# Altium footprint library nccpcblib.PcbLib: 63 footprints (part 3 of 4)
Each footprint in its own frame and in the unit in brackets; x right, y up, seen from the top. Pads: shape width x height; smd on the part's side, far side on the other; paste and mask are expansions set on the pad; w line width, h text height; cw(c..) or ccw(c..) is an arc to the next point about the centre after c.
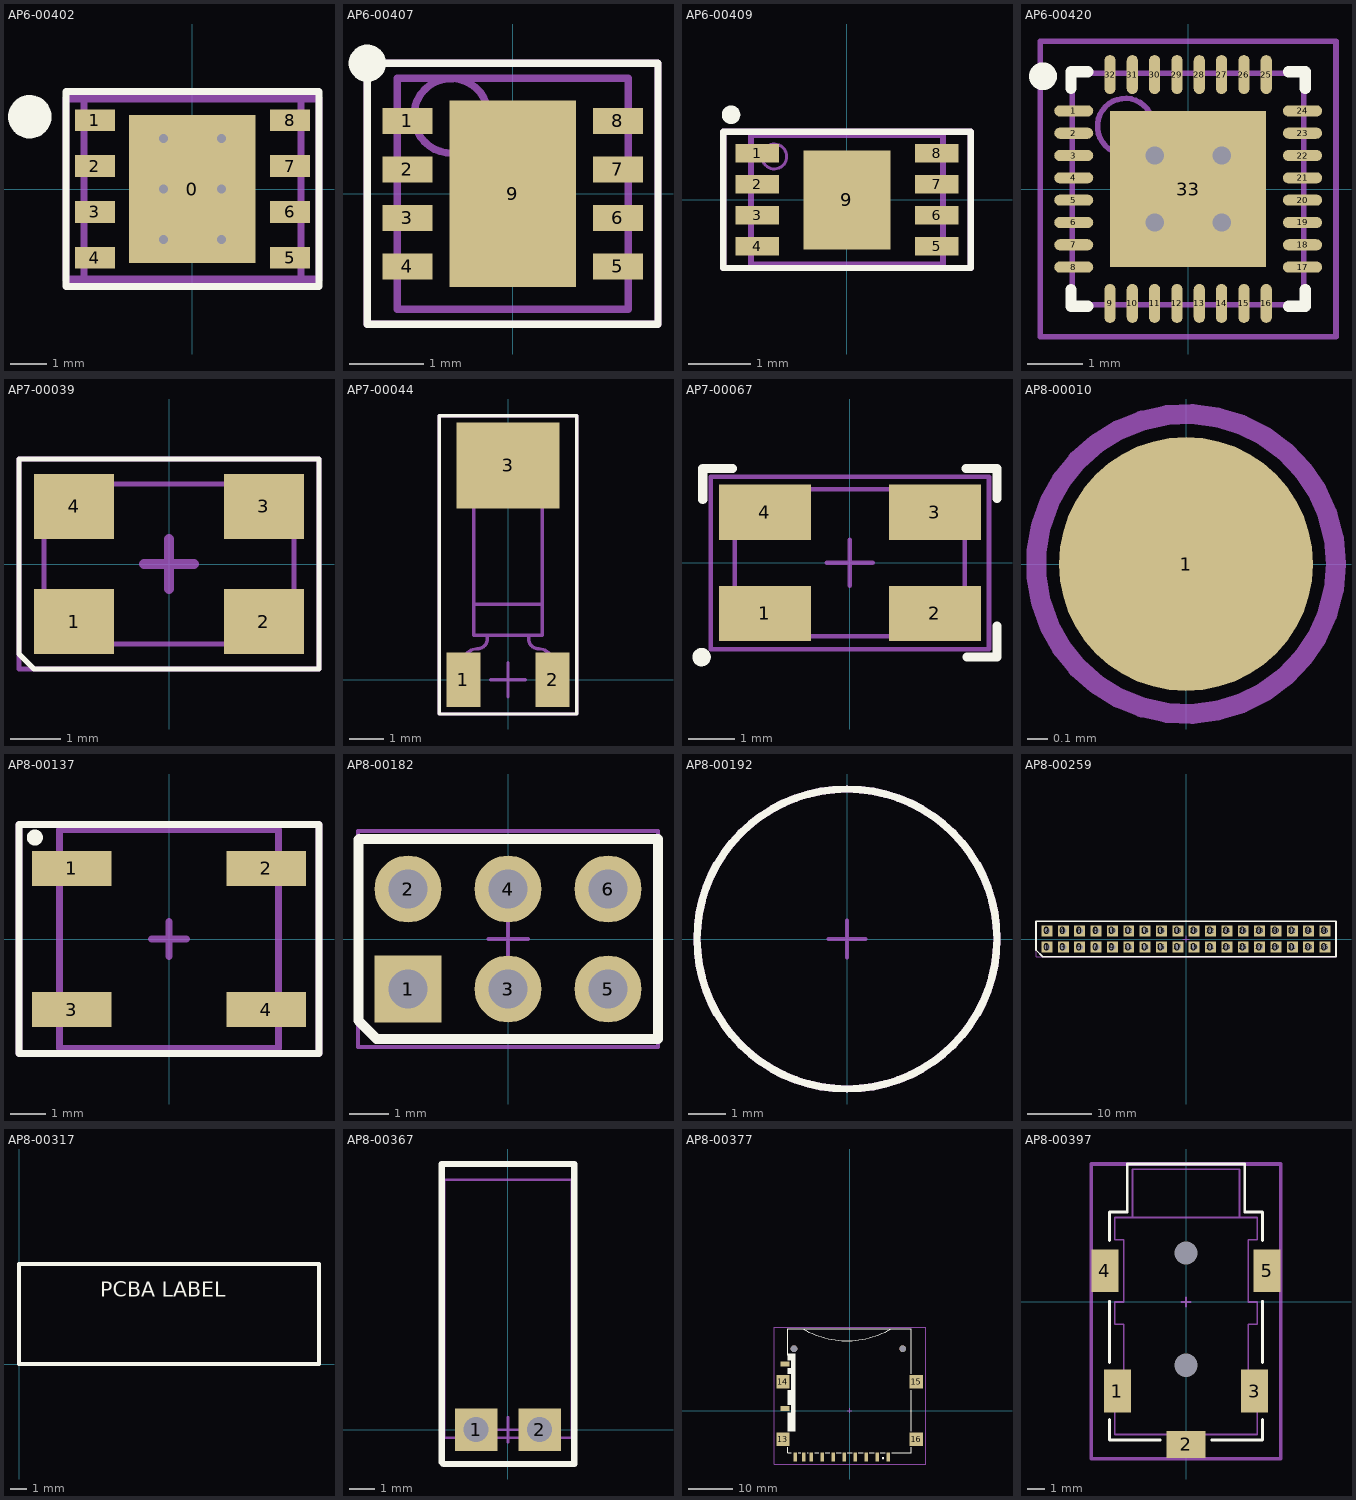
[diagram p2: the footprints below, top view; thin cyan lines are the x and y axes]

## AP6-00402 [mm]
height 5.08
pads (9):
  rect 3.5x4.1 smd: 0(0,0)
  rect 1.1x0.6 smd: 1(-2.7,1.905) 2(-2.7,0.635) 3(-2.7,-0.635) 4(-2.7,-1.905) 5(2.7,-1.905) 6(2.7,-0.635) 7(2.7,0.635) 8(2.7,1.905)
via 0.8,0 diameter 0.55 hole 0.25
via -0.8,-1.4 diameter 0.55 hole 0.25
via 0.8,-1.4 diameter 0.55 hole 0.25
via -0.8,0 diameter 0.8 hole 0.25
via 0.8,1.4 diameter 0.55 hole 0.25
via -0.8,1.4 diameter 0.55 hole 0.25
Top Overlay:
  circle w0.6: c-4.5,2 r0.3
  lines w0.2: -3.5,-2.7 -3.5,2.7 3.5,2.7 3.5,-2.7 -3.5,-2.7
Mechanical 13:
  lines w0.2: -3,-2.5 3,-2.5 3,2.5 -3,2.5 -3,-2.5
Mechanical 15:
  lines w0.2: -0.5,0 0.5,0 ; 0,-0.5 0,0.5 ; -3.5,-2.5 3.5,-2.5 3.5,2.5 -3.5,2.5 -3.5,-2.5
3D body: height 0.8, standoff 0.02, extent -3,-2.5 3,2.5

## AP6-00407 [mm] "DFN8 package"
height 0.9
pads (9):
  rect 0.675x0.35 smd: 1(-1.412,0.975) 2(-1.412,0.325) 3(-1.412,-0.325) 4(-1.412,-0.975) 5(1.412,-0.975) 6(1.412,-0.325) 7(1.412,0.325) 8(1.412,0.975)
  rect 1.7x2.5 smd paste-3: 9(0,0)
Top Overlay:
  circle w0.25: c-1.95,1.75 r0.125
  lines w0.1: -1.95,-1.75 1.95,-1.75 1.95,1.75 -1.95,1.75 -1.95,-1.75
Top Paste:
  rectangle: -0.775,-1.175 0.775,-0.05
  rectangle: -0.775,0.05 0.775,1.175
Mechanical 13:
  circle w0.1: c-0.825,1.045 r0.5
  lines w0.1: -1.55,-1.55 -1.55,1.55 1.55,1.55 1.55,-1.55 -1.55,-1.55
Mechanical 15:
  lines w0.1: -0.5,0 0.5,0 ; 0,-0.5 0,0.5 ; -1.95,-1.75 -1.95,1.75 1.95,1.75 1.95,-1.75 -1.95,-1.75
3D body: height 1, standoff 0, extent -1.55,-1.55 1.55,1.55

## AP6-00409 [mm]
height 0.6
pads (9):
  rect 0.7x0.3 smd mask+0.075: 1(-1.45,0.75) 2(-1.45,0.25) 3(-1.45,-0.25) 4(-1.45,-0.75) 5(1.45,-0.75) 6(1.45,-0.25) 7(1.45,0.25) 8(1.45,0.75)
  rect 1.4x1.6 smd paste-0.025 mask+0.075: 9(0,0)
Top Overlay:
  circle w0.15: c-1.875,1.375 r0.075
  lines w0.1: -2,-1.1 -2,1.1 2,1.1 2,-1.1 -2,-1.1
Top Solder:
  region: -1.025,-0.975 -1.025,0.975 -1.875,0.975 -1.875,-0.975
  region: 1.875,-0.975 1.875,0.975 1.025,0.975 1.025,-0.975
Mechanical 13:
  circle w0.05: c-1.175,0.7 r0.2
  lines w0.1: -1.55,-1.05 -1.55,1.05 1.55,1.05 1.55,-1.05 -1.55,-1.05
Mechanical 15:
  lines w0.1: -0.5,0 0.5,0 ; -0.5,0 0.5,0 ; -0.5,0 0.5,0 ; 0,-0.5 0,0.5 ; 0,-0.5 0,0.5 ; 0,-0.5 0,0.5 ; -2,-1.1 -2,1.1 2,1.1 2,-1.1 -2,-1.1
3D body: height 0.6, standoff 0, extent -1.55,-1.05 1.55,1.05

## AP6-00420 [mm] "QFN, 32-Leads, Body 4x4mm, Pitch 0.40mm, IPC Medium Density"
height 0.6
pads (33):
  oval 0.7x0.2 smd mask+0.05: 1(-2.05,1.4) 2(-2.05,1) 3(-2.05,0.6) 4(-2.05,0.2) 5(-2.05,-0.2) 6(-2.05,-0.6) 7(-2.05,-1) 8(-2.05,-1.4) 17(2.05,-1.4) 18(2.05,-1) 19(2.05,-0.6) 20(2.05,-0.2) 21(2.05,0.2) 22(2.05,0.6) 23(2.05,1) 24(2.05,1.4)
  oval 0.2x0.7 smd mask+0.05: 9(-1.4,-2.05) 10(-1,-2.05) 11(-0.6,-2.05) 12(-0.2,-2.05) 13(0.2,-2.05) 14(0.6,-2.05) 15(1,-2.05) 16(1.4,-2.05) 25(1.4,2.05) 26(1,2.05) 27(0.6,2.05) 28(0.2,2.05) 29(-0.2,2.05) 30(-0.6,2.05) 31(-1,2.05) 32(-1.4,2.05)
  rect 2.8x2.8 smd: 33(0,0)
via -0.6,0.6 diameter 0.66 hole 0.33
via 0.6,0.6 diameter 0.66 hole 0.33
via -0.6,-0.6 diameter 0.66 hole 0.33
via 0.6,-0.6 diameter 0.66 hole 0.33
Top Overlay:
  circle w0.25: c-2.601,2.02 r0.125
  lines w0.2: -2.1,-2.1 -1.8,-2.1 ; -2.1,-2.088 -2.1,-1.8 ; -2.1,1.8 -2.1,2.1 -1.8,2.1 ; 1.8,-2.1 2.1,-2.1 2.1,-1.8 ; 1.8,2.1 2.1,2.1 2.1,1.8
Mechanical 13:
  circle w0.1: c-1.125,1.125 r0.5
  lines w0.1: -2.075,-2.075 -2.075,2.075 2.075,2.075 2.075,-2.075 -2.075,-2.075
Mechanical 15:
  lines w0.1: -0.5,0 0.5,0 ; 0,-0.5 0,0.5 ; -2.65,-2.65 -2.65,2.65 2.65,2.65 2.65,-2.65 -2.65,-2.65
3D body: height 0.6, standoff 0.05, extent -2.075,-2.075 2.075,2.075

## AP7-00039 [mm] "FOX FQ5032B"
height 1.2
pads (4):
  rect 1.6x1.3 smd: 1(-1.9,-1.15) 2(1.9,-1.15) 3(1.9,1.15) 4(-1.9,1.15)
Top Overlay:
  lines w0.1: -3,-1.8 -3,2.1 3,2.1 3,-2.1 -2.7,-2.1 -3,-1.8
Mechanical 13:
  lines w0.1: -2.5,-1.6 2.5,-1.6 2.5,1.6 -2.5,1.6 -2.5,-1.6
Mechanical 15:
  lines w0.1: -3,-2.1 -3,2.1 3,2.1 3,-2.1 -3,-2.1
  lines w0.2: -0.5,0 0.5,0 ; 0,-0.5 0,0.5
3D body: height 1, standoff 0, extent -2.5,-1.6 2.5,1.6

## AP7-00044 [mm]
height 0.9
pads (3):
  rect 1x1.6 smd: 1(-1.3,0) 2(1.3,0)
  rect 3x2.5 smd: 3(0,6.25)
Top Overlay:
  lines w0.1: -2,-1 -2,7.7 2,7.7 2,-1 -2,-1
Mechanical 13:
  lines w0.1: -1.3,-0.7 -1.3,0.5 cw(c-0.9,0.5) -0.9,0.9 ccw(c-0.9,1.2) -0.6,1.2 -0.6,1.3 ; -1,2.2 1,2.2 ; 0.6,1.3 0.6,1.2 ccw(c0.9,1.2) 0.9,0.9 cw(c0.9,0.5) 1.3,0.5 1.3,-0.7 ; -1,1.3 1,1.3 1,7.4 -1,7.4 -1,1.3
Mechanical 15:
  lines w0.1: -0.5,0 0.5,0 ; 0,-0.5 0,0.5 ; -2,-1 2,-1 2,7.7 -2,7.7 -2,-1
3D body: height 0.5, standoff 0, extent 1.1,-0.7 1.5,0.3
3D body: height 0.5, standoff 0, extent 0.51,0.017 1.5,1.007
3D body: height 0.5, standoff 0, extent 0.51,0.724 0.91,1.3
3D body: height 0.5, standoff 0, extent -0.91,0.724 -0.51,1.3
3D body: height 0.5, standoff 0, extent -1.5,0.017 -0.51,1.007
3D body: height 0.5, standoff 0, extent -1.5,-0.7 -1.1,0.3
3D body: height 2.08, standoff 0, extent -1,1.3 1,7.4

## AP7-00067 [mm]
height 1.05
pads (4):
  rect 2x1.2 smd: 1(-1.85,-1.1) 2(1.85,-1.1) 3(1.85,1.1) 4(-1.85,1.1)
Top Overlay:
  circle w0.2: c-3.225,-2.05 r0.1
  lines w0.2: -3.2,1.375 -3.2,2.05 -2.55,2.05 ; 2.525,2.05 3.2,2.05 3.2,1.4 ; 2.55,-2.05 3.2,-2.05 3.2,-1.375
Mechanical 13:
  lines w0.1: -2.5,-1.6 2.5,-1.6 2.5,1.6 -2.5,1.6 -2.5,-1.6
Mechanical 15:
  lines w0.1: -0.5,0 0.5,0 ; 0,-0.5 0,0.5 ; -3.025,-1.875 3.025,-1.875 3.025,1.875 -3.025,1.875 -3.025,-1.875
3D body: height 1, standoff 0, extent -2.5,-1.6 2.5,1.6

## AP8-00010 [mm] "Testpad 50mil"
height 5.08
pads (1):
  round 1.27 smd paste-0.635: 1(0,0)
Mechanical 15:
  circle w0.1: c0,0 r0.75

## AP8-00137 [mm]
height 5.1
pads (4):
  rect 2.25x1 smd: 1(-2.75,2) 2(2.75,2) 3(-2.75,-2) 4(2.75,-2)
Top Overlay:
  circle w0.254: c-3.8,2.875 r0.1
  lines w0.2: -4.25,-3.25 -4.25,3.25 4.25,3.25 4.25,-3.25 -4.25,-3.25
Mechanical 13:
  lines w0.2: -3.1,-3.1 3.1,-3.1 3.1,3.1 -3.1,3.1 -3.1,-3.1
Mechanical 15:
  lines w0.2: -0.5,0 0.5,0 ; 0,-0.5 0,0.5 ; -4.25,-3.25 4.25,-3.25 4.25,3.25 -4.25,3.25 -4.25,-3.25
3D body: height 3.47, standoff -0.01, extent -3.399,-3.215 3.399,3.215

## AP8-00182 [mm] "Pin-in-Paste, Throughhole pin-header (2x3 array). Pitch 2.54 mm"
height 9.54
pads (12):
  rect 1.7x1.7 / inner round 1.7 / far side rect 1.7x1.7 hole 1: 1(-2.54,-1.27)
  rect 1.75x1.75 on Top Paste: 1(-2.54,-1.27) 2(-2.54,1.27) 3(0,-1.27) 4(0,1.27) 5(2.54,-1.27) 6(2.54,1.27)
  round 1.7 hole 1: 2(-2.54,1.27) 3(0,-1.27) 4(0,1.27) 5(2.54,-1.27) 6(2.54,1.27)
Top Overlay:
  lines w0.254: -3.8,-2.075 -3.335,-2.54 3.81,-2.54 3.81,2.54 -3.785,2.54 -3.8,2.525 -3.8,-2.075
Mechanical 15:
  lines w0.1: -0.495,0 0.505,0 ; -3.81,-2.745 3.81,-2.745 3.81,2.745 -3.81,2.745 -3.81,-2.745 ; 0,-0.5 0,0.5 0,-0.5
3D body: height 8.56, standoff -2.74, extent -3.81,-2.54 3.81,2.54

## AP8-00192 [mm]
height 2.8
Top Overlay:
  circle w0.2: c0,0 r4
Mechanical 15:
  circle w0.2: c0,0 r4
  lines w0.1: -0.5,0 0.5,0 ; 0,-0.5 0,0.5
3D body: height 2.79, standoff 0, extent -3.995,-3.999 4.001,3.999

## AP8-00259 [mm]
pads (72):
  rect 2.1x2.1 on Top Paste: 0(-21.59,-1.27) 0(-21.59,1.27) 0(-19.05,-1.27) 0(-19.05,1.27) 0(-16.51,-1.27) 0(-16.51,1.27) 0(-13.97,-1.27) 0(-13.97,1.27) 0(-11.43,-1.27) 0(-11.43,1.27) 0(-8.89,-1.27) 0(-8.89,1.27) 0(-6.35,-1.27) 0(-6.35,1.27) 0(-3.81,-1.27) 0(-3.81,1.27) 0(-1.27,-1.27) 0(-1.27,1.27) 0(1.27,-1.27) 0(1.27,1.27) 0(3.81,-1.27) 0(3.81,1.27) 0(6.35,-1.27) 0(6.35,1.27) 0(8.89,-1.27) 0(8.89,1.27) 0(11.43,-1.27) 0(11.43,1.27) 0(13.97,-1.27) 0(13.97,1.27) 0(16.51,-1.27) 0(16.51,1.27) 0(19.05,-1.27) 0(19.05,1.27) 0(21.59,-1.27) 0(21.59,1.27)
  rect 1.7x1.7 / inner round 1.7 / far side round 1.7 hole 1: 1(-21.59,-1.27) 2(-21.59,1.27) 3(-19.05,-1.27) 4(-19.05,1.27) 5(-16.51,-1.27) 6(-16.51,1.27) 7(-13.97,-1.27) 8(-13.97,1.27) 9(-11.43,-1.27) 10(-11.43,1.27) 11(-8.89,-1.27) 12(-8.89,1.27) 13(-6.35,-1.27) 14(-6.35,1.27) 15(-3.81,-1.27) 16(-3.81,1.27) 17(-1.27,-1.27) 18(-1.27,1.27) 19(1.27,-1.27) 20(1.27,1.27) 21(3.81,-1.27) 22(3.81,1.27) 23(6.35,-1.27) 24(6.35,1.27) 25(8.89,-1.27) 26(8.89,1.27) 27(11.43,-1.27) 28(11.43,1.27) 29(13.97,-1.27) 30(13.97,1.27) 31(16.51,-1.27) 32(16.51,1.27) 33(19.05,-1.27) 34(19.05,1.27) 35(21.59,-1.27) 36(21.59,1.27)
Top Overlay:
  lines w0.254: -23.3,-1.7 -22.25,-2.75 23.3,-2.75 23.3,2.75 -23.3,2.75 -23.3,-1.7
Mechanical 15:
  lines w0.1: -0.475,0 0.525,0 ; 0.025,-0.5 0.025,0.5 ; -23.3,-2.75 -23.3,2.75 23.3,2.75 23.3,-2.75 -23.3,-2.75
3D body: height 8.52, standoff -2.63, extent -23.114,-2.526 23.114,2.427

## AP8-00317 [mm] "Placement area for 18x6mm sticker"
height 2.8
Top Overlay:
  lines w0.254: 0,0 18,0 18,6 0,6 0,0
  text "PCBA LABEL" at 4.875,3.725 h1.52

## AP8-00367 [mm] "1x2 pin header, right angle, 2.54 mm pitch, through-hole"
height 8.1
pads (2):
  rect 1.7x1.7 / inner round 1.7 / far side round 1.7 hole 1: 1(-1.27,0) 2(1.27,0)
Top Overlay:
  lines w0.254: -2.645,-1.3 -2.57,-1.375 2.655,-1.375 2.655,10.6 -2.645,10.6 -2.645,-1.3
Top Paste:
  rectangle: -2.12,-0.85 -0.42,0.85
  rectangle: 0.42,-0.85 2.12,0.85
Mechanical 13:
  lines w0.1: -2.545,-0.325 -2.545,9.975 2.555,9.975 2.555,-0.325 -2.545,-0.325
Mechanical 15:
  lines w0.1: -0.495,0 0.505,0 ; 0.005,-0.5 0.005,0.5 ; -2.645,-1.375 2.655,-1.375 2.655,10.6 -2.645,10.6 -2.645,-1.375
3D body: height 2.55, standoff -1.95, extent -2.545,-0.325 2.535,9.995

## AP8-00377 [mm]
height 2.7
pads (18):
  round 1.5 hole 1.5 unplated: 0(-12.575,14) 0(12.025,14)
  rect 0.8x2 smd paste+0 mask+0.2: 1(6.305,-10.5) 2(3.805,-10.5) 3(1.305,-10.5) 4(-1.195,-10.5) 5(-3.695,-10.5) 6(-6.195,-10.5) 7(-8.625,-10.5) 8(-10.325,-10.5) 9(8.805,-10.5) 10(-12.325,-10.5)
  rect 2x1.1 smd paste+0 mask+0.2: 11(-14.575,0.45) 12(-14.575,10.5)
  rect 3x3 smd paste+0 mask+0.2: 13(-15.075,-6.5) 14(-15.075,6.5) 15(15.075,6.5) 16(15.075,-6.5)
Top Overlay:
  circle w0.25: c7.575,-10.775 r0.125
  rectangle: -13.25,-4.5 -12.195,12.3
  rectangle: -14.1,11.325 -12.2,12.875
  rectangle: -14.1,8.275 -12.2,9.675
  rectangle: -14.1,1.3 -12.2,4.7
  rectangle: -14.099,-4.725 -12.194,-0.4
  lines w0.2: -14,12.525 -14,18.499 ; -13.995,-8.33 -13.995,-9.5 -13.15,-9.5 ; -13.995,18.5 14.005,18.5 ; -11.575,-9.5 -11.05,-9.5 ; -10.575,18.5 ccw(c-0.575,35.821) 9.425,18.5 ; -9.6,-9.5 -9.35,-9.5 ; -7.9,-9.5 -6.925,-9.5 ; -5.475,-9.5 -4.425,-9.5 ; -2.975,-9.5 -1.925,-9.5 ; -0.5,-9.5 0.575,-9.5 ; 2,-9.5 3.075,-9.5 ; 4.5,-9.5 5.575,-9.5 ; 7,-9.5 8.075,-9.5 ; 9.5,-9.5 14.005,-9.5 14.005,-8.33 ; 14,-4.65 14,4.65 ; 14,8.35 14,18.495
Mechanical 15:
  lines w0.1: -0.495,0 0.505,0 ; 0.005,-0.5 0.005,0.5 ; -17.095,-12.1 17.2,-12.1 17.2,18.9 -17.095,18.9 -17.095,-12.1
3D body: height 0, standoff -0.8, extent -13.331,13.244 -11.819,14.756
3D body: height 0, standoff -0.8, extent 11.269,13.244 12.781,14.756
3D body: height 2.7, standoff 0, extent -13.994,-9.499 14.004,18.499

## AP8-00397 [mm] "3.5mm headphone jack"
height 5
pads (7):
  round 0 hole 1.3 unplated: 0(0,-3.55) 0(0,2.75)
  rect 1.5x2.4 smd: 1(-3.85,-5) 3(3.85,-5) 4(-4.55,1.75) 5(4.55,1.75)
  rect 2.2x1.5 smd: 2(0,-8)
Top Overlay:
  lines w0.15: -4.3,-6.6 -4.3,-7.75 -1.45,-7.75 ; -4.3,-3.4 -4.3,0.05 ; -4.3,3.45 -4.3,5.05 -3.3,5.05 -3.3,7.75 3.3,7.75 3.3,5.05 4.3,5.05 4.3,3.45 ; 1.45,-7.75 4.3,-7.75 4.3,-6.6 ; 4.3,-3.4 4.3,0.05
Mechanical 13:
  lines w0.1: -3,4.75 -3,7.45 3,7.45 3,4.75 ; -4,-7.45 4,-7.45 4,-6 3.5,-6 3.5,-1.25 4,-1.25 4,0 3.5,0 3.5,3.5 4,3.5 4,4.75 -4,4.75 -4,3.5 -3.5,3.5 -3.5,0 -4,0 -4,-1.25 -3.5,-1.25 -3.5,-6 -4,-6 -4,-7.45
Mechanical 15:
  lines w0.1: -0.25,0 0.25,0 ; 0,-0.25 0,0.25
  lines w0.2: -5.33,-8.8 5.32,-8.8 5.32,7.75 -5.33,7.75 -5.33,-8.8
3D body: height 6, standoff -1.2, extent -4.59,-8.29 4.61,7.51